# Altium footprint library chipfc_libs.PCBLIB: 391 footprints (part 24 of 25)
Each footprint in its own frame and in the unit in brackets; x right, y up, seen from the top. Pads: shape width x height; smd on the part's side, far side on the other; paste and mask are expansions set on the pad; w line width, h text height; cw(c..) or ccw(c..) is an arc to the next point about the centre after c.
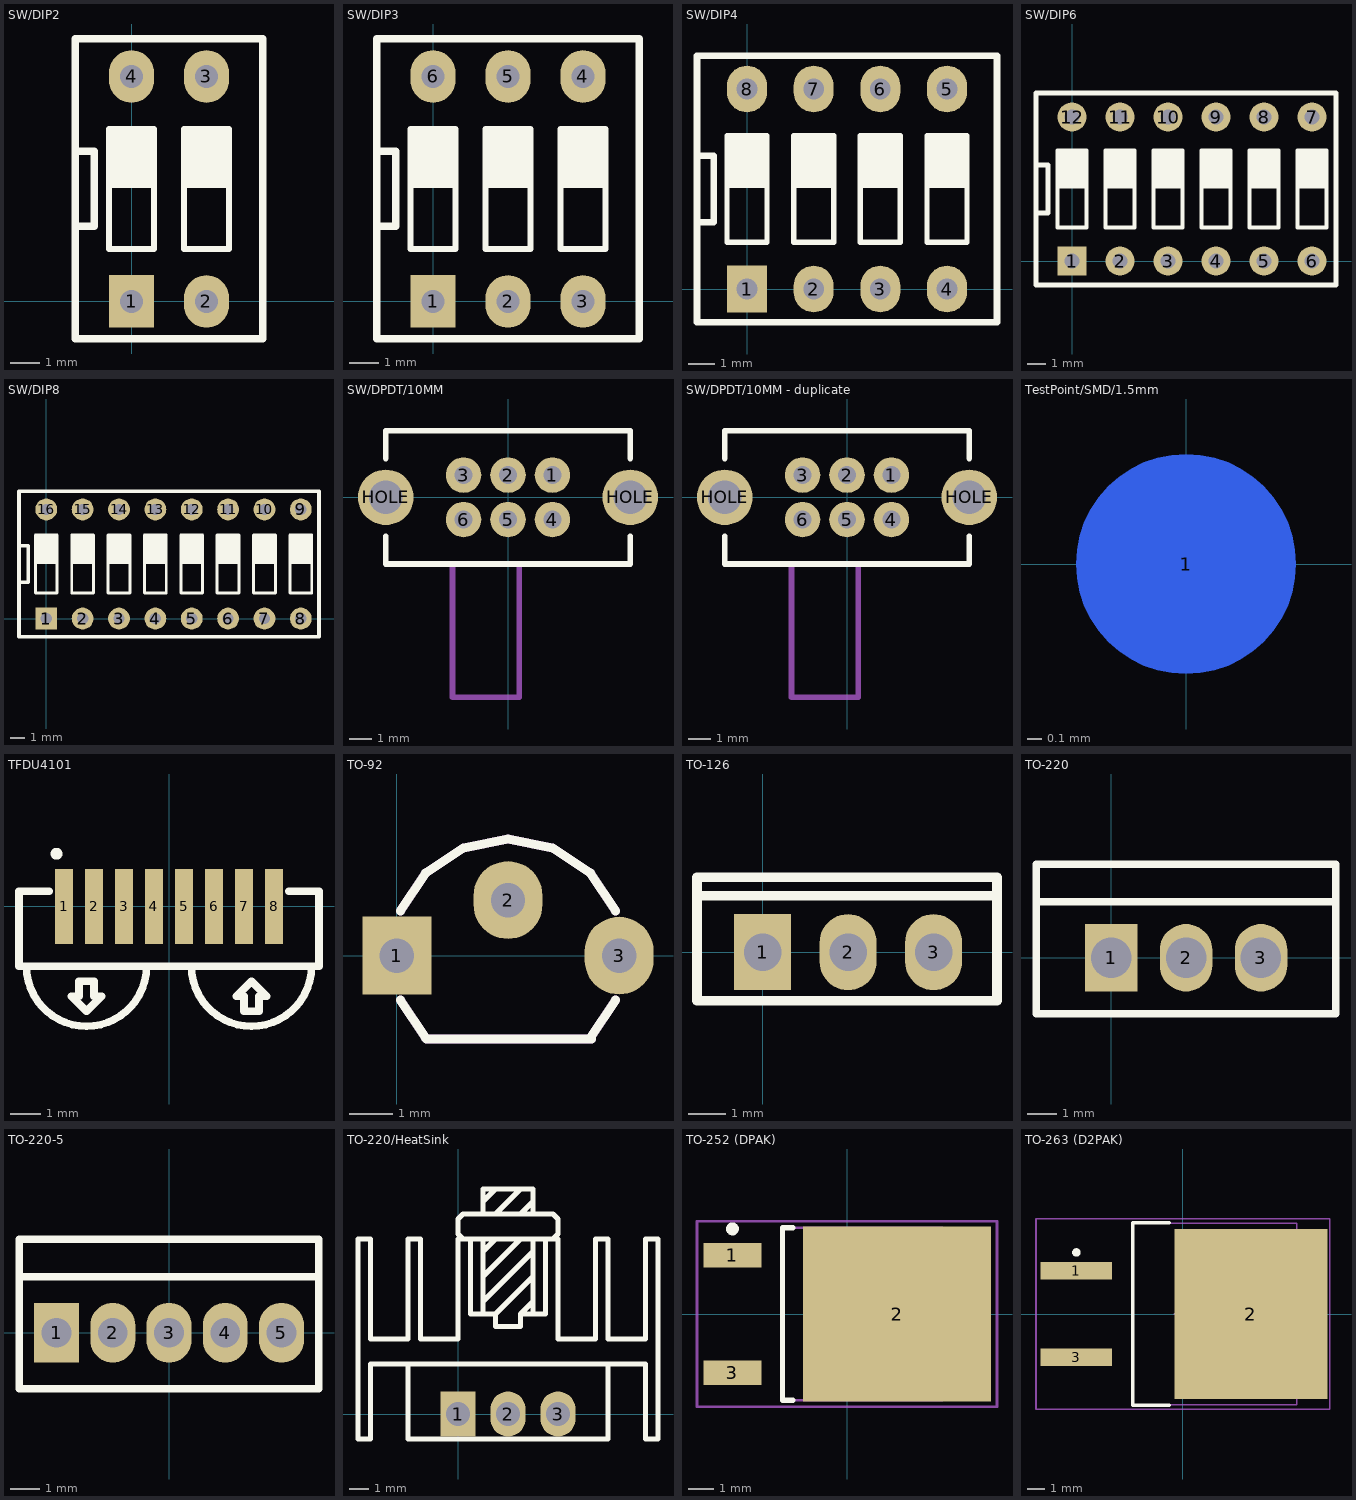
[diagram p23: the footprints below, top view; thin cyan lines are the x and y axes]

## SW/DIP2 [mil]
pads (4):
  rect 60x70 hole 31: 1(0,0)
  oval 60x70 hole 31: 2(100,0) 3(100,300) 4(0,300)
Top Overlay:
  region: 30.75,233.47 31.06,232.72 31.06,152.72 30.75,151.96 30,151.65 -30,151.65 -30.75,151.96 -31.06,152.72 -31.06,232.72 -30.75,233.47 -30,233.78 30,233.78
  region: 130.75,233.47 131.06,232.72 131.06,152.72 130.75,151.96 130,151.65 70,151.65 69.25,151.96 68.94,152.72 68.94,232.72 69.25,233.47 70,233.78 130,233.78
  lines w1.97: -30,152.72 -30,232.72 -20,232.72 30,232.72 30,152.72 -30,152.72 ; 70,152.72 130,152.72 130,232.72 80,232.72 70,232.72 70,152.72
  lines w8: -30,70 30,70 30,230 -30,230 -30,70 ; 70,70 130,70 130,230 70,230 70,70
  lines w10: -75,100 -50,100 -50,200 -75,200 ; -75,-50 175,-50 175,350 -75,350 -75,-50
3D body "User Library-DIP-Schalter SMD 2polig RM2 54.step": height 164.92, standoff -0.43, extent -50,0 150,300

## SW/DIP3 [mil]
pads (6):
  rect 60x70 hole 31: 1(0,0)
  oval 60x70 hole 31: 2(100,0) 3(200,0) 4(200,300) 5(100,300) 6(0,300)
Top Overlay:
  region: 30.75,233.47 31.06,232.72 31.06,152.72 30.75,151.96 30,151.65 -30,151.65 -30.75,151.96 -31.06,152.72 -31.06,232.72 -30.75,233.47 -30,233.78 30,233.78
  region: 130.75,233.47 131.06,232.72 131.06,152.72 130.75,151.96 130,151.65 70,151.65 69.25,151.96 68.94,152.72 68.94,232.72 69.25,233.47 70,233.78 130,233.78
  region: 230.75,233.47 231.06,232.72 231.06,152.72 230.75,151.96 230,151.65 170,151.65 169.25,151.96 168.94,152.72 168.94,232.72 169.25,233.47 170,233.78 230,233.78
  lines w1.97: -30,152.72 30,152.72 30,232.72 -20,232.72 -30,232.72 -30,152.72 ; 70,152.72 70,232.72 80,232.72 130,232.72 130,152.72 70,152.72 ; 170,152.72 230,152.72 230,232.72 170,232.72 170,152.72
  lines w8: -30,70 -30,230 30,230 30,70 -30,70 ; 70,70 70,230 130,230 130,70 70,70 ; 170,70 230,70 230,230 170,230 170,70
  lines w10: -75,100 -50,100 -50,200 -75,200 ; -75,-50 275,-50 275,350 -75,350 -75,-50
3D body "User Library-DIP-Schalter SMD 3polig RM2 54.step": height 164.92, standoff -0.43, extent -50,0 250,300

## SW/DIP4 [mil]
pads (8):
  rect 60x70 hole 31: 1(0,0)
  oval 60x70 hole 31: 2(100,0) 3(200,0) 4(300,0) 5(300,300) 6(200,300) 7(100,300) 8(0,300)
Top Overlay:
  region: 230.75,233.47 231.06,232.72 231.06,152.72 230.75,151.96 230,151.65 170,151.65 169.25,151.96 168.94,152.72 168.94,232.72 169.25,233.47 170,233.78 230,233.78
  region: 330.75,233.47 331.06,232.72 331.06,152.72 330.75,151.96 330,151.65 270,151.65 269.25,151.96 268.94,152.72 268.94,232.72 269.25,233.47 270,233.78 330,233.78
  region: 30.75,233.47 31.06,232.72 31.06,152.72 30.75,151.96 30,151.65 -30,151.65 -30.75,151.96 -31.06,152.72 -31.06,232.72 -30.75,233.47 -30,233.78 30,233.78
  region: 130.75,233.47 131.06,232.72 131.06,152.72 130.75,151.96 130,151.65 70,151.65 69.25,151.96 68.94,152.72 68.94,232.72 69.25,233.47 70,233.78 130,233.78
  lines w1.97: -30,152.72 30,152.72 30,232.72 -20,232.72 -30,232.72 -30,152.72 ; 70,152.72 130,152.72 130,232.72 80,232.72 70,232.72 70,152.72 ; 170,152.72 170,232.72 230,232.72 230,152.72 170,152.72 ; 270,152.72 270,232.72 330,232.72 330,152.72 270,152.72
  lines w8: -30,70 -30,230 30,230 30,70 -30,70 ; 70,70 70,230 130,230 130,70 70,70 ; 170,70 230,70 230,230 170,230 170,70 ; 270,70 330,70 330,230 270,230 270,70
  lines w10: -75,100 -50,100 -50,200 -75,200 ; -75,-50 375,-50 375,350 -75,350 -75,-50
3D body "User Library-DIP-Schalter SMD 4polig RM2 54.step": height 164.92, standoff -0.43, extent -50,0 350,300

## SW/DIP6 [mil]
pads (12):
  rect 60x60 / inner rect 60x80 / far side rect 60x80 hole 31: 1(0,0)
  round 60 / inner oval 60x80 / far side oval 60x80 hole 31: 2(100,0) 3(200,0) 4(300,0) 5(400,0) 6(500,0) 7(500,300) 8(400,300) 9(300,300) 10(200,300) 11(100,300) 12(0,300)
Top Overlay:
  region: 530.75,233.47 531.06,232.72 531.06,152.72 530.75,151.96 530,151.65 470,151.65 469.25,151.96 468.94,152.72 468.94,232.72 469.25,233.47 470,233.78 530,233.78
  region: 430.75,233.47 431.06,232.72 431.06,152.72 430.75,151.96 430,151.65 370,151.65 369.25,151.96 368.94,152.72 368.94,232.72 369.25,233.47 370,233.78 430,233.78
  region: 130.75,233.47 131.06,232.72 131.06,152.72 130.75,151.96 130,151.65 70,151.65 69.25,151.96 68.94,152.72 68.94,232.72 69.25,233.47 70,233.78 130,233.78
  region: 230.75,233.47 231.06,232.72 231.06,152.72 230.75,151.96 230,151.65 170,151.65 169.25,151.96 168.94,152.72 168.94,232.72 169.25,233.47 170,233.78 230,233.78
  region: 30.75,233.47 31.06,232.72 31.06,152.72 30.75,151.96 30,151.65 -30,151.65 -30.75,151.96 -31.06,152.72 -31.06,232.72 -30.75,233.47 -30,233.78 30,233.78
  region: 330.75,233.47 331.06,232.72 331.06,152.72 330.75,151.96 330,151.65 270,151.65 269.25,151.96 268.94,152.72 268.94,232.72 269.25,233.47 270,233.78 330,233.78
  lines w1.97: -30,152.72 30,152.72 30,232.72 -20,232.72 -30,232.72 -30,152.72 ; 70,152.72 130,152.72 130,232.72 80,232.72 70,232.72 70,152.72 ; 170,152.72 170,232.72 230,232.72 230,152.72 170,152.72 ; 270,152.72 270,232.72 330,232.72 330,152.72 270,152.72 ; 370,152.72 370,232.72 380,232.72 430,232.72 430,152.72 370,152.72 ; 470,152.72 530,152.72 530,232.72 480,232.72 470,232.72 470,152.72
  lines w8: -30,70 -30,230 30,230 30,70 -30,70 ; 70,70 70,230 130,230 130,70 70,70 ; 170,70 230,70 230,230 170,230 170,70 ; 270,70 330,70 330,230 270,230 270,70 ; 370,70 430,70 430,230 370,230 370,70 ; 470,70 530,70 530,230 470,230 470,70
  lines w10: -75,100 -50,100 -50,200 -75,200 ; -75,-50 550,-50 550,350 -75,350 -75,-50

## SW/DIP8 [mil]
pads (16):
  rect 60x60 / inner rect 60x80 / far side rect 60x80 hole 31: 1(0,0)
  round 60 / inner oval 60x80 / far side oval 60x80 hole 31: 2(100,0) 3(200,0) 4(300,0) 5(400,0) 6(500,0) 7(600,0) 8(700,0) 9(700,300) 10(600,300) 11(500,300) 12(400,300) 13(300,300) 14(200,300) 15(100,300) 16(0,300)
Top Overlay:
  drawing of 85 lines, arcs and shapes, not listed

## SW/DPDT/10MM [mm]
pads (8):
  round 1.6 hole 0.8: 1(2,1) 2(0,1) 3(-2,1) 4(2,-1) 5(0,-1) 6(-2,-1)
  round 2.5 hole 1.5: HOLE(-5.5,0) HOLE(5.5,0)
Top Overlay:
  lines w0.254: -5.5,-1.75 -5.5,-3 5.5,-3 5.5,-1.75 ; -5.5,1.75 -5.5,3 5.5,3 5.5,1.75
Mechanical 1:
  lines w0.254: -2.5,-3 -2.5,-9 0.5,-9 0.5,-3
3D body: height 4.5, standoff 1.5, extent -2.5,-9 0.5,-3
3D body: height 5, standoff 0, extent -5.5,-3 5.5,3

## SW/DPDT/10MM - duplicate [mm]
pads (8):
  round 1.6 hole 0.8: 1(2,1) 2(0,1) 3(-2,1) 4(2,-1) 5(0,-1) 6(-2,-1)
  round 2.5 hole 1.5: HOLE(-5.5,0) HOLE(5.5,0)
Top Overlay:
  lines w0.254: -5.5,-1.75 -5.5,-3 5.5,-3 5.5,-1.75 ; -5.5,1.75 -5.5,3 5.5,3 5.5,1.75
Mechanical 1:
  lines w0.254: -2.5,-3 -2.5,-9 0.5,-9 0.5,-3
3D body: height 4.5, standoff 1.5, extent -2.5,-9 0.5,-3
3D body: height 5, standoff 0, extent -5.5,-3 5.5,3

## TestPoint/SMD/1.5mm [mm]
pads (1):
  round 1.5 smd far side: 1(0,0)
Bottom Overlay:
  circle w0.203: c0,0 r1.024

## TFDU4101 [mm]
pads (8):
  rect 0.6x2.5 smd: 1(-3.5,0) 2(-2.5,0) 3(-1.5,0) 4(-0.5,0) 5(0.5,0) 6(1.5,0) 7(2.5,0) 8(3.5,0)
Top Overlay:
  circle w0.254: c-3.75,1.75 r0.071
  lines w0.254: -4.75,-2 ccw(c-2.75,-2) -2.75,-4 ccw(c-2.75,-2) -0.75,-2 ; -4,0.5 -5,0.5 -5,-2 5,-2 5,0.5 4,0.5 ; 0.75,-2 ccw(c2.75,-2) 2.75,-4 ccw(c2.75,-2) 4.75,-2 ; -3.25,-3 -2.75,-3.5 ; -3.25,-3 -3.25,-3 ; -3.25,-3 -3,-3 -3,-2.5 -2.5,-2.5 -2.5,-3 -2.25,-3 -2.75,-3.5 ; -2.75,-3.5 -2.75,-3.5 ; 2.75,-2.5 3.25,-3 ; 2.75,-2.5 2.75,-2.5 ; 2.75,-2.5 2.25,-3 2.5,-3 2.5,-3.5 3,-3.5 3,-3 3.25,-3 ; 3.25,-3 3.25,-3

## TO-92 [mil]
pads (3):
  rect 62x70 hole 31: 1(0,0)
  oval 62x70 hole 31: 2(100,50) 3(200,0)
Top Overlay:
  lines w8: 3.1,-40.1 25.8,-74.2 26.6,-75 175,-75 ; 3.1,40.1 25.8,74.2 59.9,96.9 100,104.9 140.1,96.9 174.2,74.2 196.9,40.1 ; 174.2,-74.2 196.9,-40.1
Mechanical 1:
  lines w8: 3.1,-40.1 25.8,-74.2 26.6,-75 175,-75 ; 3.1,40.1 25.8,74.2 59.9,96.9 100,104.9 140.1,96.9 174.2,74.2 196.9,40.1 ; 174.2,-74.2 196.9,-40.1

## TO-126 [mil]
pads (3):
  rect 60x80 hole 39.37: 1(0,0)
  oval 60x80 hole 39.37: 2(89.76,0) 3(179.53,0)
Top Overlay:
  lines w10: -68.9,59.06 246.06,59.06 ; -68.9,-51.18 -68.9,78.74 246.06,78.74 246.06,-51.18 -68.9,-51.18
3D body "User Library-BD135 (TO-126,SOT32) v4.step": height 614.17, standoff -92.33, extent -63.49,-70.82 243.6,35.49

## TO-220 [mil]
pads (3):
  rect 70x90 hole 54: 1(0,0)
  oval 70x90 hole 54: 2(100,0) 3(200,0)
Top Overlay:
  lines w10: -100,75 300,75 ; -100,-75 300,-75 300,125 -100,125 -100,-75
3D body "CircuitWorks-TO-220HS.step": height 730, standoff -150, extent -100,-50 300,130

## TO-220-5 [mil]
pads (5):
  rect 60x80 hole 39.37: 1(-150,0)
  oval 60x80 hole 39.37: 2(-75,0) 3(0,0) 4(75,0) 5(150,0)
Top Overlay:
  lines w10: -200,75 200,75 ; -200,-75 200,-75 200,125 -200,125 -200,-75

## TO-220/HeatSink [mil]
pads (3):
  rect 70x90 / inner rect 70x70 / far side rect 70x90 hole 47.24: 1(0,0)
  oval 70x90 / inner round 70 / far side oval 70x90 hole 47.24: 2(100,0) 3(200,0)
Top Overlay:
  lines w10: -100,100 -100,-50 300,-50 300,100 ; 50,200 50,350 ; 50,225 150,325 ; 50,275 125,350 ; 50,325 75,350 ; 50,400 50,450 150,450 150,400 ; 50,425 75,450 ; 75,400 125,450 ; 125,400 150,425 ; 150,200 150,350 ; 150,225 125,200 ; 150,275 75,200 ; 75,200 25,200 25,350 0,350 0,150 -75,150 -75,350 -100,350 -100,150 -175,150 -175,350 -200,350 -200,100 -200,-50 -175,-50 -175,100 375,100 375,-50 400,-50 400,100 400,350 375,350 375,150 300,150 300,350 275,350 275,150 200,150 200,350 10,350 0,360 0,390 10,400 190,400 200,390 200,360 190,350 175,350 175,200 125,200 ; 75,200 75,175 125,175 125,200
3D body "CircuitWorks-TO-220HS.step": height 805, standoff -75, extent -100,-50 300,130
3D body "User Library-heatsink TO126.step": height 984.25, standoff -149.61, extent -190.97,-51.58 390.97,373.67

## TO-252 (DPAK) [mm] "D-PAK, 3-Pads, Body 6.2x6.7mm (max), IPC Medium Density"
height 2.4
pads (3):
  rect 2.25x0.95 smd: 1(-4.45,2.28) 3(-4.45,-2.28)
  rect 7.3x6.8 smd: 2(1.95,0)
Top Overlay:
  circle w0.25: c-4.45,3.305 r0.125
  lines w0.2: -2.1,-3.35 -2.5,-3.35 -2.5,3.35 -2.1,3.35
Mechanical 13:
  lines w0.1: -2.5,-3.35 -2.5,3.35 3.7,3.35 3.7,-3.35 -2.5,-3.35
Mechanical 15:
  lines w0.1: -0.5,0 0.5,0 ; 0,-0.5 0,0.5 ; -5.825,-3.6 -5.825,3.6 5.825,3.6 5.825,-3.6 -5.825,-3.6
3D body "User Library-DPAK-1.step": height 2.41, standoff 0, extent -4.541,-3.27 5.398,3.27

## TO-263 (D2PAK) [mm]
height 4.83
pads (3):
  rect 4.2x1.05 smd: 1(-6.25,2.54) 3(-6.25,-2.54)
  rect 9x10 smd: 2(4,0)
Top Overlay:
  circle w0.25: c-6.25,3.615 r0.125
  lines w0.2: -0.8,-5.35 -2.95,-5.35 -2.95,5.35 -0.8,5.35
Mechanical 13:
  lines w0.1: -2.95,-5.325 6.7,-5.325 6.7,5.325 -2.95,5.325 -2.95,-5.325
Mechanical 15:
  lines w0.1: -0.5,0 0.5,0 ; 0,-0.5 0,0.5 ; -8.625,-5.6 8.625,-5.6 8.625,5.6 -8.625,5.6 -8.625,-5.6
3D body "SW3dPS-TO263-3S.STEP": height 4.78, standoff -0.02, extent -7.53,-5 8.14,5